# Altium footprint library agh_racing_2018.PcbLib: 174 footprints (part 8 of 11)
Each footprint in its own frame and in the unit in brackets; x right, y up, seen from the top. Pads: shape width x height; smd on the part's side, far side on the other; paste and mask are expansions set on the pad; w line width, h text height; cw(c..) or ccw(c..) is an arc to the next point about the centre after c.
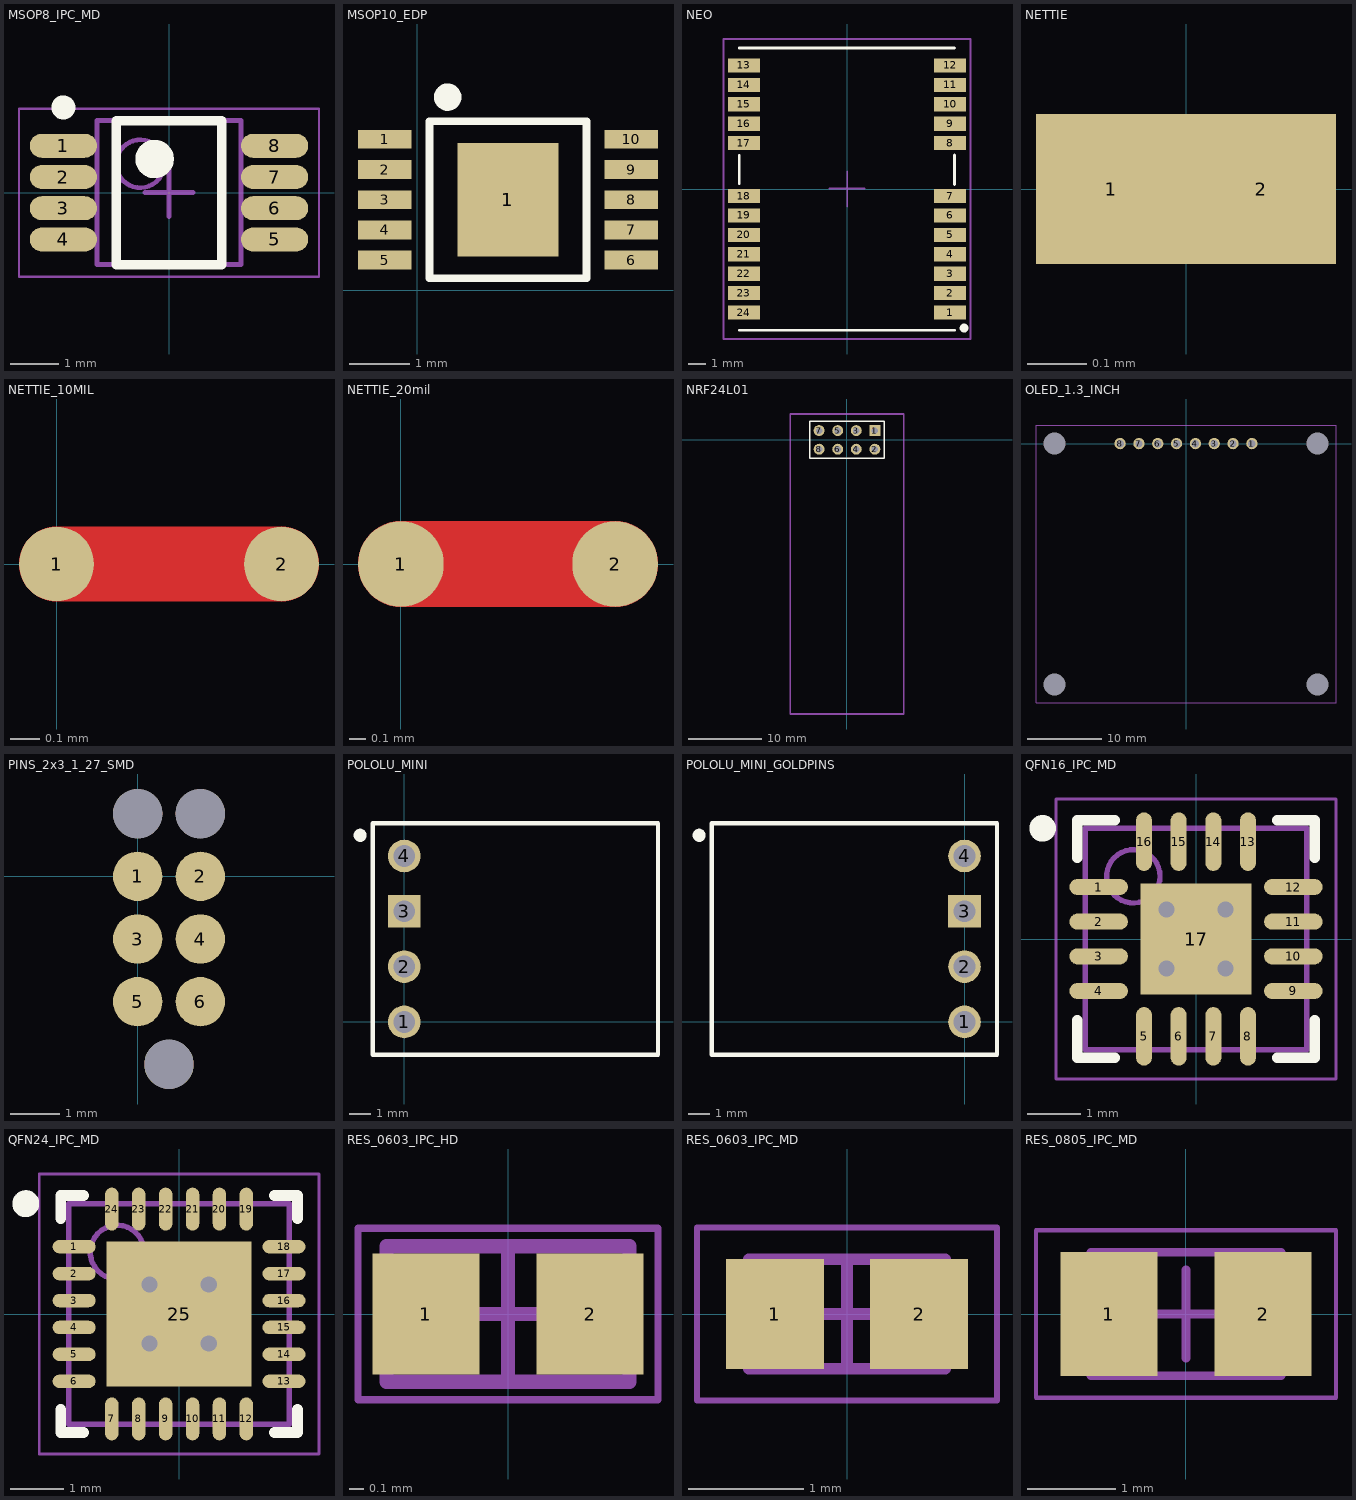
[diagram p7: the footprints below, top view; thin cyan lines are the x and y axes]

## MSOP8_IPC_MD [mm] "TSOP, 8-Leads, Body 3.00x3.00mm, Pitch 0.65mm, IPC Medium Density"
height 1.1
pads (8):
  oval 1.4x0.5 smd: 1(-2.2,0.975) 2(-2.2,0.325) 3(-2.2,-0.325) 4(-2.2,-0.975) 5(2.2,-0.975) 6(2.2,-0.325) 7(2.2,0.325) 8(2.2,0.975)
Top Overlay:
  circle w0.4: c-0.3,0.7 r0.2
  circle w0.25: c-2.2,1.775 r0.125
  lines w0.2: -1.1,-1.5 1.1,-1.5 1.1,1.5 -1.1,1.5 -1.1,-1.5
Mechanical 13:
  circle w0.1: c-0.6,0.6 r0.5
  lines w0.1: -1.5,-1.5 1.5,-1.5 1.5,1.5 -1.5,1.5 -1.5,-1.5
Mechanical 15:
  lines w0.05: -3.125,-1.75 3.125,-1.75 3.125,1.75 -3.125,1.75 -3.125,-1.75
  lines w0.1: -0.5,0 0.5,0 ; 0,-0.5 0,0.5
3D body "MSOP8_IPC_MD.step": height 1.1, standoff 0, extent -2.45,-1.5 2.45,1.5

## MSOP10_EDP [mm] "MSOP, 10-pin, Exposed Die Pad"
pads (11):
  rect 0.89x0.31 smd: 1(-0.54,2.5) 2(-0.54,2) 3(-0.54,1.5) 4(-0.54,1) 5(-0.54,0.5) 6(3.54,0.5) 7(3.54,1) 8(3.54,1.5) 9(3.54,2) 10(3.54,2.5)
  rect 1.68x1.88 smd: 1(1.5,1.5)
Top Overlay:
  circle w0.254: c0.5,3.2 r0.1
  lines w0.127: 0.2,0.2 2.8,0.2 2.8,2.8 0.2,2.8 0.2,0.2
3D body "msop-10.SLDPRT": height 1.16, standoff 0.01, extent -0.95,0 3.95,3

## NEO [mm] "u-blox NEO GNSS module"
pads (24):
  rect 1.8x0.8 smd paste-0.1: 1(5.842,-7) 2(5.842,-5.9) 3(5.842,-4.8) 4(5.842,-3.7) 5(5.842,-2.6) 6(5.842,-1.5) 7(5.842,-0.4) 8(5.842,2.6) 9(5.842,3.7) 10(5.842,4.8) 11(5.842,5.9) 12(5.842,7) 13(-5.842,7) 14(-5.842,5.9) 15(-5.842,4.8) 16(-5.842,3.7) 17(-5.842,2.6) 18(-5.842,-0.4) 19(-5.842,-1.5) 20(-5.842,-2.6) 21(-5.842,-3.7) 22(-5.842,-4.8) 23(-5.842,-5.9) 24(-5.842,-7)
Top Overlay:
  circle w0.38: c6.636,-7.879 r0.058
  lines w0.16: -6.109,-8 6.096,-8 ; -6.109,7.996 6.09,7.996 ; -6.102,0.299 -6.102,1.893 ; 6.096,0.255 6.096,1.919
Top Paste:
  rectangle: -6.833,-4.1 -5.633,-3.3
  rectangle: -6.833,-7.4 -5.633,-6.6
  rectangle: -6.833,-6.3 -5.633,-5.5
  rectangle: -6.833,-5.2 -5.633,-4.4
  rectangle: -6.833,-3 -5.633,-2.2
  rectangle: -6.833,-1.9 -5.633,-1.1
  rectangle: -6.833,-0.8 -5.633,0
  rectangle: -6.833,2.2 -5.633,3
  rectangle: -6.833,3.3 -5.633,4.1
  rectangle: -6.833,4.4 -5.633,5.2
  rectangle: -6.833,5.5 -5.633,6.3
  rectangle: -6.833,6.6 -5.633,7.4
  rectangle: 5.642,6.6 6.842,7.4
  rectangle: 5.642,5.5 6.842,6.3
  rectangle: 5.642,4.4 6.842,5.2
  rectangle: 5.642,3.3 6.842,4.1
  rectangle: 5.642,2.2 6.842,3
  rectangle: 5.642,-0.8 6.842,0
  rectangle: 5.642,-1.9 6.842,-1.1
  rectangle: 5.642,-3 6.842,-2.2
  rectangle: 5.642,-4.1 6.842,-3.3
  rectangle: 5.642,-5.2 6.842,-4.4
  rectangle: 5.642,-6.3 6.842,-5.5
  rectangle: 5.642,-7.4 6.842,-6.6
Mechanical 15:
  lines w0.1: -1,0.024 0.02,0.024 ; 0.02,-1 0.02,0.024 ; 0.02,1 0.02,0.024 ; 1,0.024 0.02,0.024 ; -7,-8.5 -7,8.5 7,8.5 7,-8.5 -7,-8.5
3D body "NEO (STEP-AP214)_B.STEP": height 2.28, standoff -0.05, extent -6.104,-8 6.096,8

## NETTIE [mil]
pads (2):
  rect 10x10 smd paste+0 mask+0: 1(-5,0) 2(5,0)

## NETTIE_10MIL [mil]
pads (2):
  round 10 smd paste+0 mask+0: 1(0,0) 2(30,0)
Top Layer:
  lines w10: 0,0 30,0

## NETTIE_20mil [mil]
pads (2):
  round 20 smd paste+0 mask+0: 1(0,0) 2(50,0)
Top Layer:
  lines w20: 0,0 50,0

## NRF24L01 [mm]
pads (8):
  rect 1.5x1.5 hole 0.9: 1(3.81,1.27)
  round 1.5 hole 0.9: 2(3.81,-1.27) 3(1.27,1.27) 4(1.27,-1.27) 5(-1.27,1.27) 6(-1.27,-1.27) 7(-3.81,1.27) 8(-3.81,-1.27)
Top Overlay:
  lines w0.2: -5.08,0 -5.08,2.54 5.08,2.54 5.08,0 ; -5.08,0.54 -5.08,-2.54 5.08,-2.54 5.08,0.54
Mechanical 1:
  lines w0.254: -7.75,-37.46 7.75,-37.46 7.75,3.54 -7.75,3.54 -7.75,-37.46
3D body "EL-02001-AA NRF42L01.STEP": height 16.39, standoff -4.6, extent -7.75,-146.656 7.75,3.54

## OLED_1.3_INCH [mm]
pads (12):
  round 1.524 hole 1: 1(8.89,0) 2(6.35,0) 3(3.81,0) 4(1.27,0) 5(-1.27,0) 6(-3.81,0) 7(-6.35,0) 8(-8.89,0)
  round 0 hole 3: ""(-17.75,-32.5) ""(-17.75,0) ""(17.75,-32.5) ""(17.75,0)
Mechanical 1:
  lines w0.1: -20.25,-35 20.25,-35 20.25,2.5 -20.25,2.5 -20.25,-35
3D body: height 12.5, standoff 7.5, extent -20.25,-35 20.25,2.5

## PINS_2x3_1_27_SMD [mm]
pads (9):
  round 1 smd mask+0.025: 1(0,0) 2(1.27,0) 3(0,-1.27) 4(1.27,-1.27) 5(0,-2.54) 6(1.27,-2.54)
  round 1 hole 1 unplated mask+0.025: ""(0,1.27) ""(0.635,-3.81) ""(1.27,1.27)

## POLOLU_MINI [mm]
height 2.8
pads (4):
  round 1.5 hole 1: 1(0,0) 2(0,2.54) 4(0,7.62)
  rect 1.5x1.5 hole 1: 3(0,5.08)
Top Overlay:
  circle w0.4: c-2.025,8.57 r0.1
  lines w0.2: -1.45,-1.505 11.65,-1.505 11.65,9.12 -1.45,9.12 -1.45,-1.505
3D body "Pololu 2843 5V Step Down Regulator.STEP": height 2.79, standoff 0, extent -1.313,-1.384 11.514,9.004

## POLOLU_MINI_GOLDPINS [mm]
height 5.4
pads (4):
  round 1.5 hole 1: 1(0,0) 2(0,2.54) 4(0,7.62)
  rect 1.5x1.5 hole 1: 3(0,5.08)
Top Overlay:
  circle w0.4: c-12.185,8.57 r0.1
  lines w0.2: -11.61,-1.505 1.49,-1.505 1.49,9.12 -11.61,9.12 -11.61,-1.505
3D body "PololuWithGoldpins.STEP": height 5.69, standoff -5.85, extent -11.493,-1.372 1.333,9.017

## QFN16_IPC_MD [mm] "QFN, 16-Leads, Body 4.00x4.00mm, Pitch 0.65mm, Thermal Pad 2.08x2.08mm, IPC Medium Density"
height 0.8
pads (17):
  oval 1.1x0.3 smd: 1(-1.825,0.975) 2(-1.825,0.325) 3(-1.825,-0.325) 4(-1.825,-0.975) 9(1.825,-0.975) 10(1.825,-0.325) 11(1.825,0.325) 12(1.825,0.975)
  oval 0.3x1.1 smd: 5(-0.975,-1.825) 6(-0.325,-1.825) 7(0.325,-1.825) 8(0.975,-1.825) 13(0.975,1.825) 14(0.325,1.825) 15(-0.325,1.825) 16(-0.975,1.825)
  rect 2.08x2.08 smd: 17(0,0)
via 0.55,-0.55 diameter 0.711 hole 0.3
via -0.55,-0.55 diameter 0.711 hole 0.3
via 0.55,0.55 diameter 0.711 hole 0.3
via -0.55,0.55 diameter 0.711 hole 0.3
Top Overlay:
  circle w0.25: c-2.875,2.075 r0.125
  lines w0.2: -2.225,-1.525 -2.225,-2.225 -1.525,-2.225 ; -2.225,1.525 -2.225,2.225 -1.525,2.225 ; 1.525,-2.225 2.225,-2.225 2.225,-1.525 ; 1.525,2.225 2.225,2.225 2.225,1.525
Mechanical 13:
  circle w0.1: c-1.175,1.175 r0.5
  lines w0.1: -2.075,-2.075 2.075,-2.075 2.075,2.075 -2.075,2.075 -2.075,-2.075
Mechanical 15:
  lines w0.05: -2.625,-2.625 2.625,-2.625 2.625,2.625 -2.625,2.625 -2.625,-2.625
  lines w0.1: -0.5,0 0.5,0 ; 0,-0.5 0,0.5
3D body "QFN16_IPC_MD.step": height 0.8, standoff 0, extent -2.085,-2.085 2.085,2.085

## QFN24_IPC_MD [mm] "QFN, 24-Leads, Body 4,00x4,00mm, Pitch 0,50mm, Thermal Pad 2,70x2,70mm, IPC Medium Density"
height 0.95
pads (25):
  oval 0.8x0.25 smd: 1(-1.95,1.25) 2(-1.95,0.75) 3(-1.95,0.25) 4(-1.95,-0.25) 5(-1.95,-0.75) 6(-1.95,-1.25) 13(1.95,-1.25) 14(1.95,-0.75) 15(1.95,-0.25) 16(1.95,0.25) 17(1.95,0.75) 18(1.95,1.25)
  oval 0.25x0.8 smd: 7(-1.25,-1.95) 8(-0.75,-1.95) 9(-0.25,-1.95) 10(0.25,-1.95) 11(0.75,-1.95) 12(1.25,-1.95) 19(1.25,1.95) 20(0.75,1.95) 21(0.25,1.95) 22(-0.25,1.95) 23(-0.75,1.95) 24(-1.25,1.95)
  rect 2.7x2.7 smd: 25(0,0)
via -0.55,0.55 diameter 0.711 hole 0.3
via 0.55,0.55 diameter 0.711 hole 0.3
via 0.55,-0.55 diameter 0.711 hole 0.3
via -0.55,-0.55 diameter 0.711 hole 0.3
Top Overlay:
  circle w0.25: c-2.85,2.05 r0.125
  lines w0.2: -2.2,-1.775 -2.2,-2.2 -1.775,-2.2 ; -2.2,1.775 -2.2,2.2 -1.775,2.2 ; 1.775,-2.2 2.2,-2.2 2.2,-1.775 ; 1.775,2.2 2.2,2.2 2.2,1.775
Mechanical 13:
  circle w0.1: c-1.15,1.15 r0.5
  lines w0.1: -2.05,-2.05 -2.05,2.05 2.05,2.05 2.05,-2.05 -2.05,-2.05
Mechanical 15:
  lines w0.05: -2.6,-2.6 -2.6,2.6 2.6,2.6 2.6,-2.6 -2.6,-2.6
  lines w0.1: -0.5,0 0.5,0 ; 0,-0.5 0,0.5
3D body "QFN24_IPC_MD.step": height 0.95, standoff 0, extent -2.051,-2.051 2.051,2.051

## RES_0603_IPC_HD [mm] "Chip Resistor, 2-Leads, Body 1,55x0,80mm, IPC High Density"
height 0.55
pads (2):
  rect 0.75x0.85 smd: 1(-0.575,0) 2(0.575,0)
Mechanical 13:
  lines w0.1: -0.85,-0.475 -0.85,0.475 0.85,0.475 0.85,-0.475 -0.85,-0.475
Mechanical 15:
  lines w0.05: -1.05,-0.6 -1.05,0.6 1.05,0.6 1.05,-0.6 -1.05,-0.6
  lines w0.1: -0.475,0 0.475,0 ; 0,-0.475 0,0.475
3D body "RES_0603_HD.step": height 0.55, standoff 0, extent -0.85,-0.475 0.85,0.475

## RES_0603_IPC_MD [mm] "Chip Resistor, 2-Leads, Body 1,55x0,80mm, IPC Medium Density"
height 0.55
pads (2):
  rect 0.85x0.95 smd: 1(-0.625,0) 2(0.625,0)
Mechanical 13:
  lines w0.1: -0.85,-0.475 0.85,-0.475 0.85,0.475 -0.85,0.475 -0.85,-0.475
Mechanical 15:
  lines w0.05: -1.3,-0.75 1.3,-0.75 1.3,0.75 -1.3,0.75 -1.3,-0.75
  lines w0.1: -0.475,0 0.475,0 ; 0,-0.475 0,0.475
3D body "RES_0603_IPC_MD.step": height 0.55, standoff 0, extent -0.85,-0.475 0.85,0.475

## RES_0805_IPC_MD [mm] "Chip Resistor, 2-Leads, 0805, Royal Ohm, IPC Medium Density"
height 0.65
pads (2):
  rect 1.1x1.4 smd: 1(-0.875,0) 2(0.875,0)
Mechanical 13:
  lines w0.1: -1.075,-0.7 -1.075,0.7 1.075,0.7 1.075,-0.7 -1.075,-0.7
Mechanical 15:
  lines w0.05: -1.7,-0.95 1.7,-0.95 1.7,0.95 -1.7,0.95 -1.7,-0.95
  lines w0.1: -0.5,0 0.5,0 ; 0,-0.5 0,0.5
3D body "RES_0805_IPC_MD.step": height 0.65, standoff 0, extent -1.075,-0.7 1.075,0.7